# Altium footprint library PartsDatabaseV16.1.PcbLib: 145 footprints (part 9 of 10)
Each footprint in its own frame and in the unit in brackets; x right, y up, seen from the top. Pads: shape width x height; smd on the part's side, far side on the other; paste and mask are expansions set on the pad; w line width, h text height; cw(c..) or ccw(c..) is an arc to the next point about the centre after c.
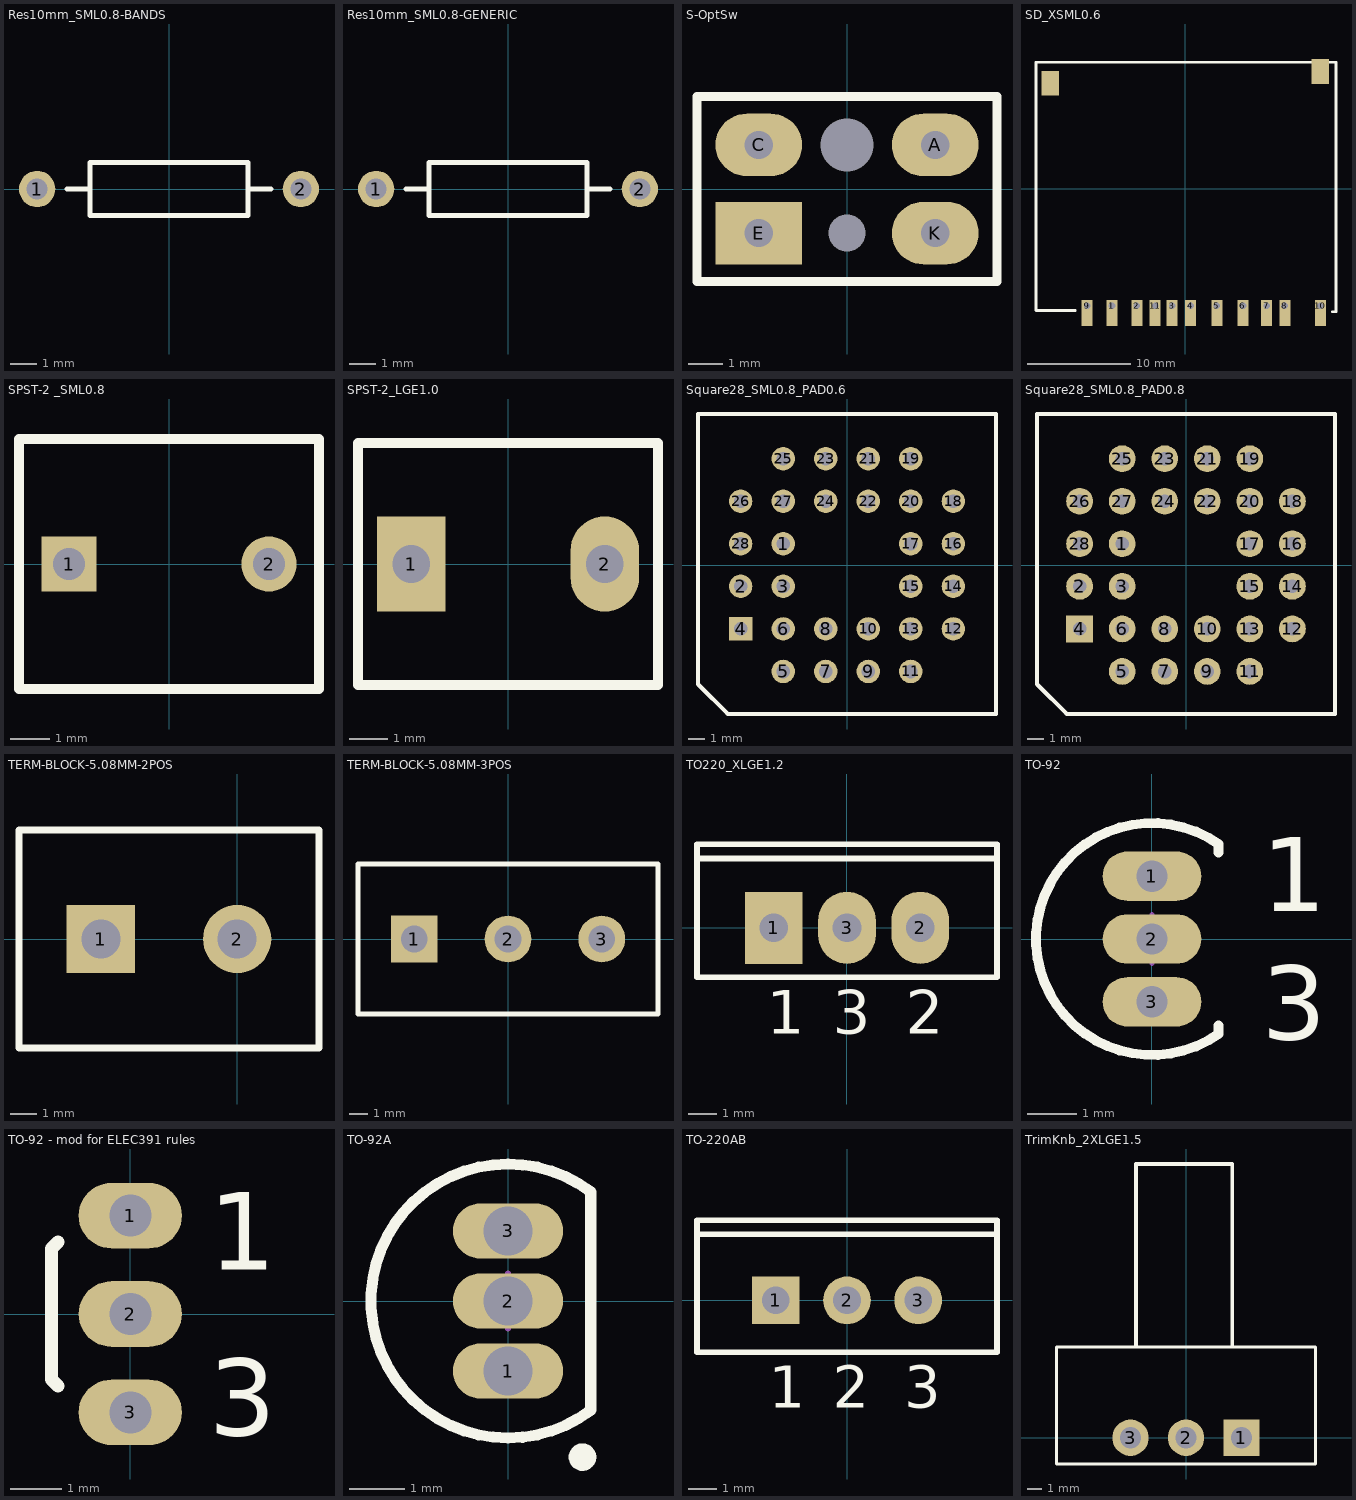
[diagram p8: the footprints below, top view; thin cyan lines are the x and y axes]

## Res10mm_SML0.8-BANDS [mm] "Axial Device, Thru-Hole; 2 Leads; 0.4 in Pin Spacing"
pads (2):
  round 1.4 hole 0.813: 1(-5.08,0) 2(5.08,0)
Top Overlay:
  lines w0.2: -3.924,0 -3.048,0 ; 3.048,0 3.924,0 ; -3.048,-1.016 -3.048,1.016 3.048,1.016 3.048,-1.016 -3.048,-1.016
3D body "Resistor_ColorBands.step": height 2.5, standoff -2.98, extent -5.398,-1.194 5.372,1.118

## Res10mm_SML0.8-GENERIC [mm] "Axial Device, Thru-Hole; 2 Leads; 0.4 in Pin Spacing"
pads (2):
  round 1.4 hole 0.813: 1(-5.08,0) 2(5.08,0)
Top Overlay:
  lines w0.2: -3.924,0 -3.048,0 ; 3.048,0 3.924,0 ; -3.048,-1.016 3.048,-1.016 3.048,1.016 -3.048,1.016 -3.048,-1.016
3D body "User Library-quarter_watt_resistor_400spacing.step": height 2.98, standoff -5.82, extent -5.406,-1.325 5.406,1.275

## S-OptSw [mm] "Opt Switch"
pads (6):
  round 0 hole 1.524 unplated: 5(0,1.27)
  round 0 hole 1.067 unplated: 6(0,-1.27)
  oval 2.5x1.8 hole 0.813: A(2.54,1.27) C(-2.54,1.27) K(2.54,-1.27)
  rect 2.5x1.8 hole 0.813: E(-2.54,-1.27)
Top Overlay:
  lines w0.254: -4.318,-2.667 4.318,-2.667 4.318,2.667 -4.318,2.667 -4.318,-2.667

## SD_XSML0.6 [mil] "SD card, surface mount"
pads (13):
  rect 42x100 hole 25 copper offset 0,-27: 1(-280,-447.5) 2(-185,-447.5) 3(-50,-447.5) 4(20,-447.5) 5(120,-447.5) 6(220,-447.5) 7(310,-447.5) 8(380,-447.5) 9(-375,-447.5) 10(515,-447.5) 11(-115,-447.5)
  rect 66.93x94.49 smd: ""(-515,402.5) ""(515,447.5)
Top Overlay:
  lines w10: -420,-465 -570,-465 -570,482.5 575,482.5 575,-470 560,-470

## SPST-2 _SML0.8 [mm] "Circuit Breaker; 2 Leads"
pads (2):
  rect 1.4x1.4 hole 0.813: 1(-2.54,0)
  round 1.4 hole 0.813: 2(2.54,0)
Top Overlay:
  lines w0.254: -3.81,-3.175 -3.81,3.175 3.175,3.175 3.81,3.175 3.81,-3.175 -3.81,-3.175

## SPST-2_LGE1.0 [mm] "Circuit Breaker; 2 Leads"
pads (2):
  rect 1.8x2.5 hole 0.991: 1(-2.54,0)
  oval 1.8x2.5 hole 0.991: 2(2.54,0)
Top Overlay:
  lines w0.254: 3.429,3.175 3.937,3.175 3.937,-3.175 -3.937,-3.175 -3.937,3.175 3.683,3.175

## Square28_SML0.8_PAD0.6 [mm] "DIP; 28 Rectangular Pins; Row Space 7.62 mm; Pitch 2.54 mm"
height 11.94
pads (28):
  round 1.4 hole 0.813: 1(-3.81,1.27) 2(-6.35,-1.27) 3(-3.81,-1.27) 5(-3.81,-6.35) 6(-3.81,-3.81) 7(-1.27,-6.35) 8(-1.27,-3.81) 9(1.27,-6.35) 10(1.27,-3.81) 11(3.81,-6.35) 12(6.35,-3.81) 13(3.81,-3.81) 14(6.35,-1.27) 15(3.81,-1.27) 16(6.35,1.27) 17(3.81,1.27) 18(6.35,3.81) 19(3.81,6.35) 20(3.81,3.81) 21(1.27,6.35) 22(1.27,3.81) 23(-1.27,6.35) 24(-1.27,3.81) 25(-3.81,6.35) 26(-6.35,3.81) 27(-3.81,3.81) 28(-6.35,1.27)
  rect 1.4x1.4 hole 0.813: 4(-6.35,-3.81)
Top Overlay:
  lines w0.25: -8.89,-7.099 -8.89,9.017 8.89,9.017
  lines w0.254: -8.89,-7.112 -7.112,-8.89 8.89,-8.89 8.89,9.017

## Square28_SML0.8_PAD0.8 [mm] "DIP; 28 Rectangular Pins; Row Space 7.62 mm; Pitch 2.54 mm"
height 11.94
pads (28):
  round 1.6 hole 0.813: 1(-3.81,1.27) 2(-6.35,-1.27) 3(-3.81,-1.27) 5(-3.81,-6.35) 6(-3.81,-3.81) 7(-1.27,-6.35) 8(-1.27,-3.81) 9(1.27,-6.35) 10(1.27,-3.81) 11(3.81,-6.35) 12(6.35,-3.81) 13(3.81,-3.81) 14(6.35,-1.27) 15(3.81,-1.27) 16(6.35,1.27) 17(3.81,1.27) 18(6.35,3.81) 19(3.81,6.35) 20(3.81,3.81) 21(1.27,6.35) 22(1.27,3.81) 23(-1.27,6.35) 24(-1.27,3.81) 25(-3.81,6.35) 26(-6.35,3.81) 27(-3.81,3.81) 28(-6.35,1.27)
  rect 1.6x1.6 hole 0.813: 4(-6.35,-3.81)
Top Overlay:
  lines w0.25: -8.89,-7.099 -8.89,9.017 8.89,9.017
  lines w0.254: -8.89,-7.112 -7.112,-8.89 8.89,-8.89 8.89,9.017

## TERM-BLOCK-5.08MM-2POS [mil] "TERM BLOCK 5.08MM VERT 2POS PCB"
pads (2):
  rect 100x100 hole 57: 1(-200,0)
  round 100 hole 57: 2(0,0)
Top Overlay:
  lines w10: -320,-160 -320,160 120,160 120,-160 -320,-160

## TERM-BLOCK-5.08MM-3POS [mil] "TERM BLOCK 5.08MM VERT 3POS PCB"
pads (3):
  rect 100x100 hole 57: 1(-200,0)
  round 100 hole 57: 2(0,0) 3(200,0)
Top Overlay:
  lines w10: -320,-160 320,-160 320,160 -320,160 -320,-160

## TO220_XLGE1.2 [mm] "TO, Thru-Hole, Vertical, Heatsink Mounted; 3 In-Line Leads; Pitch 2.54 mm; Pin sequence 1, 3, 2"
height 19.7
pads (3):
  rect 2x2.5 hole 0.991: 1(-2.54,0)
  oval 2x2.5 hole 0.991: 2(2.54,0) 3(0,0)
Top Overlay:
  lines w0.2: -5.2,2.4 5.2,2.4 ; -5.2,-1.714 5.2,-1.714 5.2,2.9 -5.2,2.9 -5.2,-1.714
  text "3" at -0.5,-3.675 h1.5
  text "2" at 2.04,-3.675 h1.5
  text "1" at -2.79,-3.675 h1.5

## TO-92 [mm] "TO, Flat Index; 3 In-Line, Axial Leads; Body Dia. 4.6mm; Leads 0.41 x 0.39 mm (max)"
height 4.7
pads (3):
  oval 2x1 hole 0.635: 1(0,1.27) 2(0,0) 3(0,-1.27)
Top Overlay:
  lines w0.2: 1.35,-1.75 1.35,-1.92 cw(c0,0) 1.35,1.92 1.35,1.75
  text "1" at 2.224,0.56 h1.5
  text "3" at 2.224,-2.035 h1.5
Mechanical 15:
  lines w0.1: -0.5,0 0.5,0 ; 0,-0.5 0,0.5

## TO-92 - mod for ELEC391 rules [mm] "TO, Flat Index; 3 In-Line, Axial Leads; Body Dia. 4.6mm; Leads 0.41 x 0.39 mm (max)"
height 4.7
pads (3):
  oval 2x1.27 hole 0.813: 1(0,1.905) 2(0,0) 3(0,-1.905)
Top Overlay:
  lines w0.254: -1.397,-1.397 -1.524,-1.27 -1.524,1.27 -1.397,1.397
  text "3" at 1.524,-2.357 h1.5
  text "1" at 1.524,0.857 h1.5
Mechanical 15:
  lines w0.1: -0.5,0 0.5,0
3D body "Homemade_TO-92.STEP": height 2.55, standoff -1.55, extent -7.011,-0.124 4.287,5.407

## TO-92A [mm] "TO, Flat Index; 3 In-Line, Axial Leads; Body Dia. 4.5mm; Leads 0.51 x 0.48 mm (max)"
height 6.86
pads (3):
  oval 2x1 hole 0.889: 1(0,-1.27) 2(0,0) 3(0,1.27)
Top Overlay:
  circle w0.25: c1.35,-2.83 r0.125
  lines w0.2: 1.5,-1.98 cw(c0,0) 1.5,1.98 1.5,-1.98
Mechanical 13:
  lines w0.1: 1.5,-1.98 cw(c0,0) 1.5,1.98 1.5,-1.98
Mechanical 15:
  lines w0.1: -0.5,0 0.5,0 ; 0,-0.5 0,0.5
3D body "TO-92A.step": height 8, standoff -3, extent -2.371,-2.412 1.559,2.388

## TO-220AB [mm] "TO, Thru-Hole, Vertical, Heatsink Mounted; 3 In-Line Leads; Pitch 2.54 mm"
height 19.3
pads (3):
  rect 1.7x1.7 hole 0.991: 1(-2.54,0)
  round 1.7 hole 0.991: 2(0,0) 3(2.54,0)
Top Overlay:
  lines w0.2: -5.35,2.35 5.35,2.35 ; -5.35,-1.85 5.35,-1.85 5.35,2.85 -5.35,2.85 -5.35,-1.85
  text "1" at -2.79,-3.825 h1.5
  text "2" at -0.5,-3.825 h1.5
  text "3" at 2.04,-3.825 h1.5
3D body "TO-220.STEP": height 19.4, standoff -9.4, extent -5.062,-1.74 5.138,2.76

## TrimKnb_2XLGE1.5 [mm] "Variable Resistor, Thru-Hole, 3 Leads, knob"
pads (3):
  rect 2.5x2.5 hole 1.448: 1(3.81,0)
  round 2.5 hole 1.448: 2(0,0) 3(-3.81,0)
Top Overlay:
  lines w0.2: -8.89,-1.803 8.865,-1.803 ; -8.89,-1.778 -8.89,6.223 8.89,6.223 8.89,-1.803
  lines w0.254: -3.429,6.274 -3.429,18.796 3.175,18.796 3.175,6.274